# Altium footprint library WE-RJ45 LAN.PcbLib: 103 footprints (part 4 of 7)
Each footprint in its own frame and in the unit in brackets; x right, y up, seen from the top. Pads: shape width x height; smd on the part's side, far side on the other; paste and mask are expansions set on the pad; w line width, h text height; cw(c..) or ccw(c..) is an arc to the next point about the centre after c.
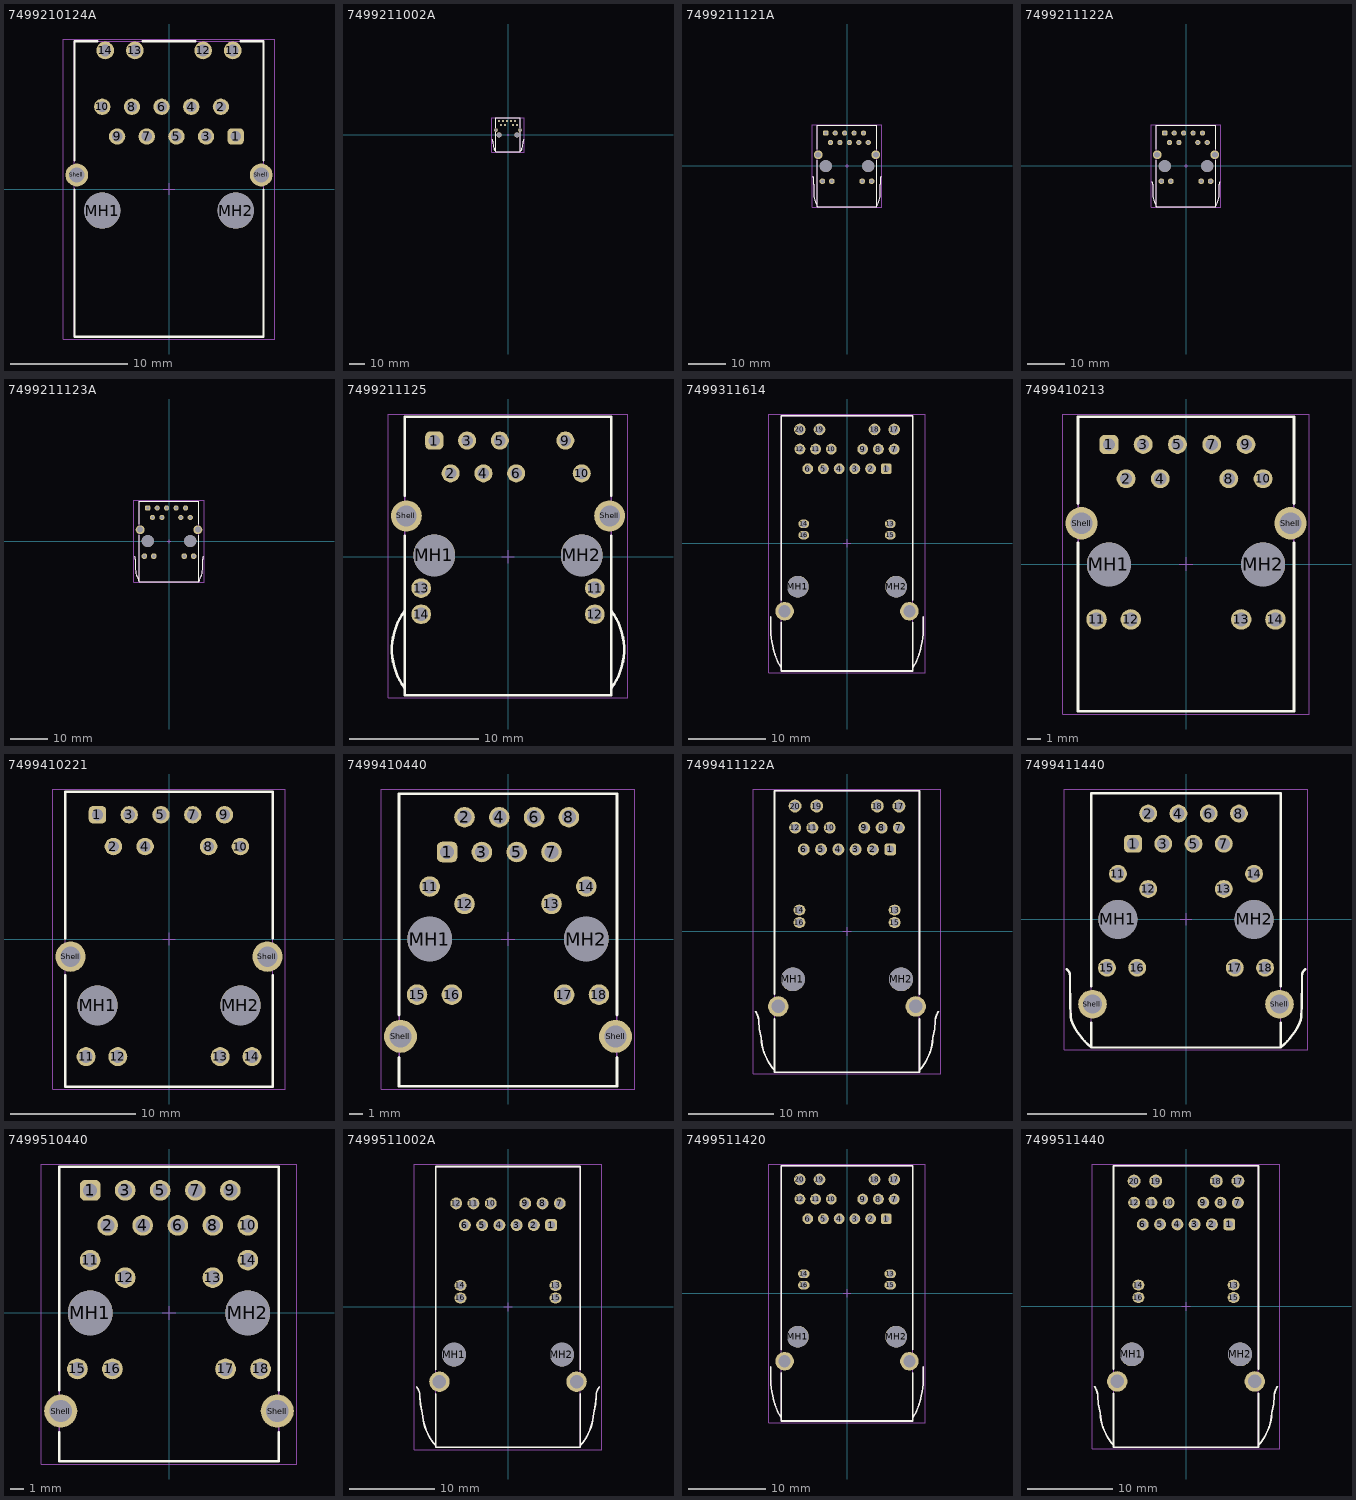
[diagram p3: the footprints below, top view; thin cyan lines are the x and y axes]

## 7499210124A [mm] "LAN Transformer, body 25.3x16.2mm"
height 13.5
pads (18):
  rrect50% 1.4x1.4 hole 0.9: 1(5.715,4.5)
  round 1.4 hole 0.9: 2(4.445,7.04) 3(3.175,4.5) 4(1.905,7.04) 5(0.635,4.5) 6(-0.635,7.04) 7(-1.905,4.5) 8(-3.175,7.04) 9(-4.445,4.5) 10(-5.715,7.04)
  round 1.52 hole 1.02: 11(5.465,11.87) 12(2.925,11.87) 13(-2.925,11.87) 14(-5.465,11.87)
  round 3.1 hole 3.1 unplated: MH1(-5.715,-1.85) MH2(5.715,-1.85)
  round 1.95 hole 1.3: Shell(-7.9,1.2) Shell(7.9,1.2)
Top Overlay:
  lines w0.2: -8.1,-0.05 -8.1,-12.65 8.1,-12.65 8.1,-0.05 ; -8.1,2.45 -8.1,12.65 -6.15,12.65 ; -2.24,12.65 2.24,12.65 ; 6.15,12.65 8.1,12.65 8.1,2.45
M11 Assembly Top:
  lines w0.1: -8.1,-12.65 -8.1,12.65 8.1,12.65 8.1,-12.65 -8.1,-12.65
  text ".Designator" at -1.75,-0.75 h1.5
M13 3D Top:
  lines w0.1: -8.1,-12.65 8.1,-12.65 8.1,12.65 -8.1,12.65 -8.1,-12.65
M15 Courtyard Top:
  lines w0.05: -0.5,0 0.5,0 ; 0,-0.5 0,0.5 ; -9.075,-12.85 9.075,-12.85 9.075,12.85 -9.075,12.85 -9.075,-12.85
3D body "7499210124A.stp": height 13.65, standoff -3.34, extent -8.1,-12.65 8.1,12.65

## 7499211002A [mm] "LAN Transformer, body 21.84x15.88mm"
height 13.74
pads (13):
  rrect50% 1.4x1.4 hole 0.9: 1(-5.715,8.86)
  round 1.4 hole 0.9: 2(-4.445,6.32) 3(-3.175,8.86) 4(-1.905,6.32) 5(-0.635,8.86) 7(1.905,8.86) 8(3.175,6.32) 9(4.445,8.86) 10(5.715,6.32)
  round 3.25 hole 3.25 unplated: MH1(-5.715,-0.03) MH2(5.715,-0.03)
  round 2.4 hole 1.6: Shell(-7.74,3.02) Shell(7.74,3.02)
Top Overlay:
  lines w0.2: -10.007,-3.268 cw(c-10.365,-3.895) -9.651,-3.996 ccw(c3.06,-5.02) -9.609,-6.473 ccw(c4.624,-3.611) -8.749,-9.262 cw(c-48.755,-34.72) -8.151,-10.228 cw(c-9.338,-11.119) -7.94,-10.62 ; -7.94,1.53 -7.94,-10.92 7.94,-10.92 7.94,1.53 ; -7.94,4.48 -7.94,10.92 7.94,10.92 7.94,4.48 ; 7.94,-10.62 cw(c9.338,-11.119) 8.151,-10.228 cw(c48.755,-34.72) 8.749,-9.262 ccw(c-4.624,-3.611) 9.609,-6.473 ccw(c-3.06,-5.02) 9.651,-3.996 cw(c10.365,-3.895) 10.007,-3.268
M11 Assembly Top:
  lines w0.1: -10.007,-3.268 cw(c-10.365,-3.895) -9.651,-3.996 ccw(c3.06,-5.02) -9.609,-6.473 ccw(c4.624,-3.611) -8.749,-9.262 cw(c-48.755,-34.72) -8.151,-10.228 cw(c-9.338,-11.119) -7.94,-10.62 ; 7.94,-10.62 cw(c9.338,-11.119) 8.151,-10.228 cw(c48.755,-34.72) 8.749,-9.262 ccw(c-4.624,-3.611) 9.609,-6.473 ccw(c-3.06,-5.02) 9.651,-3.996 cw(c10.365,-3.895) 10.007,-3.268 ; -7.94,-10.92 7.94,-10.92 7.94,10.92 -7.94,10.92 -7.94,-10.92
  text ".Designator" at -1.75,-0.75 h1.5
M13 3D Top:
  lines w0.1: -10.007,-3.268 cw(c-10.365,-3.895) -9.651,-3.996 ccw(c3.06,-5.02) -9.609,-6.473 ccw(c4.624,-3.611) -8.749,-9.262 cw(c-48.755,-34.72) -8.151,-10.228 cw(c-9.338,-11.119) -7.94,-10.62 ; 7.94,-10.62 cw(c9.338,-11.119) 8.151,-10.228 cw(c48.755,-34.72) 8.749,-9.262 ccw(c-4.624,-3.611) 9.609,-6.473 ccw(c-3.06,-5.02) 9.651,-3.996 cw(c10.365,-3.895) 10.007,-3.268 ; -7.94,-10.92 -7.94,10.92 7.94,10.92 7.94,-10.92 -7.94,-10.92
M15 Courtyard Top:
  lines w0.05: -0.5,0 0.5,0 ; 0,-0.5 0,0.5 ; -10.34,-11.12 10.46,-11.12 10.46,11.12 -10.34,11.12 -10.34,-11.12
3D body "7499211002A.stp": height 16.02, standoff -3.35, extent -10.14,-10.92 10.14,10.92

## 7499211121A [mm] "LAN Transformer, body 21.84x15.88mm"
height 13.95
pads (18):
  rrect50% 1.4x1.4 hole 0.9: 1(-5.715,8.86)
  round 1.4 hole 0.9: 2(-4.445,6.32) 3(-3.175,8.86) 4(-1.905,6.32) 5(-0.635,8.86) 6(0.635,6.32) 7(1.905,8.86) 8(3.175,6.32) 9(4.445,8.86) 10(5.715,6.32)
  round 1.52 hole 1.02: 11(-6.63,-4.11) 12(-4.09,-4.11) 13(4.09,-4.11) 14(6.63,-4.11)
  round 3.25 hole 3.25 unplated: MH1(-5.715,-0.03) MH2(5.715,-0.03)
  round 2.4 hole 1.6: Shell(-7.745,3.02) Shell(7.745,3.02)
Top Overlay:
  lines w0.2: -9.102,-2.811 cw(c-10.213,-3.423) -8.946,-3.48 -8.953,-4.892 ccw(c-5.338,-5.332) -8.98,-5.362 ccw(c15.684,-6.19) -8.909,-8.234 ccw(c-0.49,-6.715) -7.94,-10.92 ; -7.94,1.53 -7.94,-10.92 ; -7.94,4.53 -7.94,10.92 7.94,10.92 7.94,4.53 ; 7.94,1.53 7.94,-10.92 ; 9.102,-2.811 ccw(c10.213,-3.423) 8.946,-3.48 8.953,-4.892 cw(c5.338,-5.332) 8.98,-5.362 cw(c-15.684,-6.19) 8.909,-8.234 cw(c0.49,-6.715) 7.94,-10.92 ; -7.94,-10.92 7.94,-10.92
M11 Assembly Top:
  lines w0.1: -9.102,-2.811 cw(c-10.213,-3.423) -8.946,-3.48 -8.953,-4.892 ccw(c-5.338,-5.332) -8.98,-5.362 ccw(c15.684,-6.19) -8.909,-8.234 ccw(c-0.49,-6.715) -7.94,-10.92 ; 9.102,-2.811 ccw(c10.213,-3.423) 8.946,-3.48 8.953,-4.892 cw(c5.338,-5.332) 8.98,-5.362 cw(c-15.684,-6.19) 8.909,-8.234 cw(c0.49,-6.715) 7.94,-10.92 ; -7.94,-10.92 -7.94,10.92 7.94,10.92 7.94,-10.92 ; -7.94,-10.92 7.94,-10.92
  text ".Designator" at -1.75,-0.75 h1.5
M13 3D Top:
  lines w0.1: -9.102,-2.811 cw(c-10.213,-3.423) -8.946,-3.48 -8.953,-4.892 ccw(c-5.338,-5.332) -8.98,-5.362 ccw(c15.684,-6.19) -8.909,-8.234 ccw(c-0.49,-6.715) -7.94,-10.92 ; 9.102,-2.811 ccw(c10.213,-3.423) 8.946,-3.48 8.953,-4.892 cw(c5.338,-5.332) 8.98,-5.362 cw(c-15.684,-6.19) 8.909,-8.234 cw(c0.49,-6.715) 7.94,-10.92 ; -7.94,-10.92 7.94,-10.92 ; -7.94,-10.92 -7.94,10.92 7.94,10.92 7.94,-10.92
M15 Courtyard Top:
  lines w0.05: -0.5,0 0.5,0 ; 0,-0.5 0,0.5 ; -9.402,-11.12 -9.402,11.12 9.402,11.12 9.402,-11.12 -9.402,-11.12
3D body "7499211121A.stp": height 15.79, standoff -3.37, extent -9.111,-10.92 9.111,10.92

## 7499211122A [mm] "LAN Transformer, body 21.84x15.88mm"
height 13.74
pads (17):
  rrect50% 1.4x1.4 hole 0.9: 1(-5.715,8.86)
  round 1.4 hole 0.9: 2(-4.445,6.32) 3(-3.175,8.86) 4(-1.905,6.32) 5(-0.635,8.86) 7(1.905,8.86) 8(3.175,6.32) 9(4.445,8.86) 10(5.715,6.32)
  round 1.52 hole 1.02: 11(-6.63,-4.11) 12(-4.09,-4.11) 13(4.09,-4.11) 14(6.63,-4.11)
  round 3.25 hole 3.25 unplated: MH1(-5.715,-0.03) MH2(5.715,-0.03)
  round 2.4 hole 1.6: Shell(-7.745,3.02) Shell(7.745,3.02)
Top Overlay:
  lines w0.2: -9.109,-4.223 cw(c-10.22,-4.835) -8.953,-4.892 ccw(c-5.338,-5.332) -8.98,-5.362 ccw(c15.684,-6.19) -8.909,-8.234 ccw(c-0.49,-6.715) -7.94,-10.92 ; -7.94,1.53 -7.94,-10.92 ; -7.94,4.48 -7.94,10.92 7.94,10.92 7.94,4.48 ; 7.94,1.53 7.94,-10.92 ; 9.109,-4.223 ccw(c10.22,-4.835) 8.953,-4.892 cw(c5.338,-5.332) 8.98,-5.362 cw(c-15.684,-6.19) 8.909,-8.234 cw(c0.49,-6.715) 7.94,-10.92 ; -7.94,-10.92 7.94,-10.92
M11 Assembly Top:
  lines w0.1: -9.109,-4.223 cw(c-10.22,-4.835) -8.953,-4.892 ccw(c-5.338,-5.332) -8.98,-5.362 ccw(c15.684,-6.19) -8.909,-8.234 ccw(c-0.49,-6.715) -7.94,-10.92 ; 9.109,-4.223 ccw(c10.22,-4.835) 8.953,-4.892 cw(c5.338,-5.332) 8.98,-5.362 cw(c-15.684,-6.19) 8.909,-8.234 cw(c0.49,-6.715) 7.94,-10.92 ; -7.94,-10.92 7.94,-10.92 ; -7.94,-10.92 -7.94,10.92 7.94,10.92 7.94,-10.92
  text ".Designator" at -1.75,-0.75 h1.5
M13 3D Top:
  lines w0.1: -9.109,-4.223 cw(c-10.22,-4.835) -8.953,-4.892 ccw(c-5.338,-5.332) -8.98,-5.362 ccw(c15.684,-6.19) -8.909,-8.234 ccw(c-0.49,-6.715) -7.94,-10.92 ; 9.109,-4.223 ccw(c10.22,-4.835) 8.953,-4.892 cw(c5.338,-5.332) 8.98,-5.362 cw(c-15.684,-6.19) 8.909,-8.234 cw(c0.49,-6.715) 7.94,-10.92 ; -7.94,-10.92 -7.94,10.92 7.94,10.92 7.94,-10.92 ; -7.94,-10.92 7.94,-10.92
M15 Courtyard Top:
  lines w0.05: -0.5,0 0.5,0 ; 0,-0.5 0,0.5 ; -9.41,-11.12 9.41,-11.12 9.41,11.12 -9.41,11.12 -9.41,-11.12
3D body "7499211122A.stp": height 15.24, standoff -3.32, extent -9.163,-10.92 9.163,10.92

## 7499211123A [mm] "LAN Transformer, body 21.6x16mm"
height 13.95
pads (17):
  rrect50% 1.4x1.4 hole 0.9: 1(-5.715,8.98)
  round 1.4 hole 0.9: 2(-4.445,6.44) 3(-3.175,8.98) 4(-1.905,6.44) 5(-0.635,8.98) 7(1.905,8.98) 8(3.175,6.44) 9(4.445,8.98) 10(5.715,6.44)
  round 1.52 hole 1.02: 11(-6.63,-3.97) 12(-4.09,-3.97) 13(4.09,-3.97) 14(6.63,-3.97)
  round 3.25 hole 3.25 unplated: MH1(-5.715,0.09) MH2(5.715,0.09)
  round 2.4 hole 1.6: Shell(-7.745,3.14) Shell(7.745,3.14)
Top Overlay:
  lines w0.2: -9.169,-4.103 cw(c-10.28,-4.715) -9.013,-4.772 ccw(c-5.398,-5.212) -9.04,-5.242 ccw(c15.624,-6.07) -8.969,-8.114 ccw(c-0.55,-6.595) -8,-10.8 ; -8,1.65 -8,-10.8 ; -8,4.6 -8,10.8 8,10.8 8,4.6 ; 8,1.65 8,-10.8 ; 9.169,-4.103 ccw(c10.28,-4.715) 9.013,-4.772 cw(c5.398,-5.212) 9.04,-5.242 cw(c-15.624,-6.07) 8.969,-8.114 cw(c0.55,-6.595) 8,-10.8 ; -8,-10.8 8,-10.8
M11 Assembly Top:
  lines w0.1: -9.169,-4.103 cw(c-10.28,-4.715) -9.013,-4.772 ccw(c-5.398,-5.212) -9.04,-5.242 ccw(c15.624,-6.07) -8.969,-8.114 ccw(c-0.55,-6.595) -8,-10.8 ; 9.169,-4.103 ccw(c10.28,-4.715) 9.013,-4.772 cw(c5.398,-5.212) 9.04,-5.242 cw(c-15.624,-6.07) 8.969,-8.114 cw(c0.55,-6.595) 8,-10.8 ; -8,-10.8 8,-10.8 ; -8,-10.8 -8,10.8 8,10.8 8,-10.8
  text ".Designator" at -1.75,-0.75 h1.5
M13 3D Top:
  lines w0.1: -9.169,-4.103 cw(c-10.28,-4.715) -9.013,-4.772 ccw(c-5.398,-5.212) -9.04,-5.242 ccw(c15.624,-6.07) -8.969,-8.114 ccw(c-0.55,-6.595) -8,-10.8 ; 9.169,-4.103 ccw(c10.28,-4.715) 9.013,-4.772 cw(c5.398,-5.212) 9.04,-5.242 cw(c-15.624,-6.07) 8.969,-8.114 cw(c0.55,-6.595) 8,-10.8 ; -8,-10.8 -8,10.8 8,10.8 8,-10.8 ; -8,-10.8 8,-10.8
M15 Courtyard Top:
  lines w0.05: -0.5,0 0.5,0 ; 0,-0.5 0,0.5 ; -9.47,-11 -9.47,11 9.47,11 9.47,-11 -9.47,-11
3D body "7499211123A.stp": height 15.27, standoff -3.6, extent -9.223,-10.8 9.223,10.8

## 7499211125 [mm] "LAN Transformer, body 21.3x16mm"
height 13.55
pads (16):
  rrect50% 1.4x1.4 hole 0.89: 1(-5.715,8.99)
  round 1.4 hole 0.89: 2(-4.445,6.45) 3(-3.175,8.99) 4(-1.905,6.45) 5(-0.635,8.99) 6(0.635,6.45) 9(4.445,8.99) 10(5.715,6.45)
  round 1.52 hole 1.02: 11(6.725,-2.44) 12(6.725,-4.47) 13(-6.725,-2.44) 14(-6.725,-4.47)
  round 3.25 hole 3.25 unplated: MH1(-5.715,0.1) MH2(5.715,0.1)
  round 2.4 hole 1.6: Shell(-7.875,3.15) Shell(7.875,3.15)
Top Overlay:
  lines w0.2: -8,-10.2 cw(c-4,-7.2) -8,-4.2 ; -8,1.6 -8,-10.75 8,-10.75 8,1.6 ; -8,4.7 -8,10.85 8,10.85 8,4.7 ; 8,-10.2 ccw(c4,-7.2) 8,-4.2
M11 Assembly Top:
  lines w0.1: -8,-10.2 cw(c-4,-7.2) -8,-4.2 ; 8,-10.2 ccw(c4,-7.2) 8,-4.2 ; -8,-10.75 -8,10.85 8,10.85 8,-10.75 ; -8,-10.75 8,-10.75 ; -8,-10.75 8,-10.75
  text ".Designator" at -1.75,-0.75 h1.5
M13 3D Top:
  lines w0.1: -8,-10.2 cw(c-4,-7.2) -8,-4.2 ; 8,-10.2 ccw(c4,-7.2) 8,-4.2 ; -8,-10.75 8,-10.75 8,10.85 -8,10.85 -8,-10.75
M15 Courtyard Top:
  lines w0.05: -0.5,0 0.5,0 ; 0,-0.5 0,0.5 ; -9.275,-10.95 9.275,-10.95 9.275,11.05 -9.275,11.05 -9.275,-10.95
3D body "7499211125.stp": height 14.65, standoff -2.98, extent -8.956,-10.75 8.956,10.85

## 7499311614 [mm] "10/100/1000 Base-T, PoE, THT, 1x1, Tab up, with shield tabs, with LED L-R green/orange-yellow, ETR"
height 13.87
pads (24):
  rrect50% 1.4x1.4 hole 0.89: 1(5.075,9.63)
  round 1.4 hole 0.89: 2(3.045,9.63) 3(1.015,9.63) 4(-1.015,9.63) 5(-3.045,9.63) 6(-5.075,9.63) 7(6.09,12.17) 8(4.06,12.17) 9(2.03,12.17) 10(-2.03,12.17) 11(-4.06,12.17) 12(-6.09,12.17)
  oval 1.4x1.1 hole 0.89: 13(5.59,2.51) 14(-5.59,2.51) 15(5.59,1.05) 16(-5.59,1.05)
  round 1.5 hole 1.02: 17(6.095,14.71) 18(3.555,14.71) 19(-3.555,14.71) 20(-6.095,14.71)
  round 2.8 hole 2.8 unplated: MH1(-6.35,-5.61) MH2(6.35,-5.61)
  round 2.4 hole 1.57: Shell(-8.065,-8.79) Shell(8.065,-8.79)
Top Overlay:
  lines w0.2: -9.857,-9.51 -9.857,-11.238 ccw(c1.3,-10.91) -9.621,-13.217 ccw(c-1.503,-11.736) -8.5,-16.11 ; -8.5,-10.21 -8.5,-16.51 8.5,-16.51 8.5,-10.21 ; -8.5,-7.37 -8.5,16.51 8.5,16.51 8.5,-7.37 ; 8.5,-16.11 ccw(c1.503,-11.736) 9.621,-13.217 ccw(c-1.3,-10.91) 9.857,-11.238 9.857,-9.51
M11 Assembly Top:
  lines w0.1: -9.857,-9.51 -9.857,-11.238 ccw(c1.3,-10.91) -9.621,-13.217 ccw(c-1.503,-11.736) -8.5,-16.11 ; 8.5,-16.11 ccw(c1.503,-11.736) 9.621,-13.217 ccw(c-1.3,-10.91) 9.857,-11.238 9.857,-9.51 ; -8.5,-16.51 -8.5,16.51 8.5,16.51 8.5,-16.51 -8.5,-16.51
  text ".Designator" at -1.75,-0.75 h1.5
M13 3D Top:
  lines w0.1: -9.857,-9.51 -9.857,-11.238 ccw(c1.3,-10.91) -9.621,-13.217 ccw(c-1.503,-11.736) -8.5,-16.11 ; 8.5,-16.11 ccw(c1.503,-11.736) 9.621,-13.217 ccw(c-1.3,-10.91) 9.857,-11.238 9.857,-9.51 ; -8.5,-16.51 8.5,-16.51 8.5,16.51 -8.5,16.51 -8.5,-16.51
M15 Courtyard Top:
  lines w0.05: -0.5,0 0.5,0 ; 0,-0.5 0,0.5 ; -10.09,-16.71 -10.09,16.71 10.09,16.71 10.09,-16.71 -10.09,-16.71
3D body "7499311614.stp": height 15.53, standoff -3.32, extent -9.89,-16.51 9.89,16.51

## 7499410213 [mm] "LAN Transformer, body 21.84x16mm"
height 13.74
pads (17):
  rrect50% 1.4x1.4 hole 0.9: 1(-5.715,8.86)
  round 1.4 hole 0.9: 2(-4.445,6.32) 3(-3.175,8.86) 4(-1.905,6.32) 5(-0.635,8.86) 7(1.905,8.86) 8(3.175,6.32) 9(4.445,8.86) 10(5.715,6.32)
  round 1.52 hole 1.02: 11(-6.63,-4.11) 12(-4.09,-4.11) 13(4.09,-4.11) 14(6.63,-4.11)
  round 3.25 hole 3.25 unplated: MH1(-5.715,-0.03) MH2(5.715,-0.03)
  round 2.4 hole 1.6: Shell(-7.745,3.02) Shell(7.745,3.02)
Top Overlay:
  lines w0.2: -8,1.58 -8,-10.92 8,-10.92 8,1.58 ; -8,4.48 -8,10.92 8,10.92 8,4.48
M11 Assembly Top:
  lines w0.1: -8,-10.92 -8,10.92 8,10.92 8,-10.92 -8,-10.92
  text ".Designator" at -1.75,-0.75 h1.5
M13 3D Top:
  lines w0.1: -8,-10.92 8,-10.92 8,10.92 -8,10.92 -8,-10.92
M15 Courtyard Top:
  lines w0.05: -0.5,0 0.5,0 ; 0,-0.5 0,0.5 ; -9.145,-11.12 9.145,-11.12 9.145,11.12 -9.145,11.12 -9.145,-11.12
3D body "7499410213.stp": height 13.92, standoff -3.25, extent -8,-10.92 8,10.92

## 7499410221 [mm] "LAN Transformer, body 23.6x16.6mm"
height 17.1
pads (17):
  rrect50% 1.4x1.4 hole 0.89: 1(-5.72,9.94)
  round 1.4 hole 0.89: 2(-4.45,7.4) 3(-3.18,9.94) 4(-1.91,7.4) 5(-0.64,9.94) 7(1.9,9.94) 8(3.17,7.4) 9(4.44,9.94) 10(5.71,7.4)
  round 1.52 hole 1.02: 11(-6.635,-9.41) 12(-4.095,-9.41) 13(4.095,-9.41) 14(6.635,-9.41)
  round 3.2 hole 3.2 unplated: MH1(-5.715,-5.3) MH2(5.715,-5.3)
  round 2.43 hole 1.63: Shell(-7.875,-1.41) Shell(7.875,-1.41)
Top Overlay:
  lines w0.2: -8.3,-2.9 -8.3,-11.8 8.3,-11.8 8.3,-2.9 ; -8.3,0.05 -8.3,11.8 8.3,11.8 8.3,0.05
M11 Assembly Top:
  lines w0.1: -8.3,-11.8 -8.3,11.8 8.3,11.8 8.3,-11.8 -8.3,-11.8
  text ".Designator" at -1.75,-0.75 h1.5
M13 3D Top:
  lines w0.1: -8.3,-11.8 8.3,-11.8 8.3,11.8 -8.3,11.8 -8.3,-11.8
M15 Courtyard Top:
  lines w0.05: -0.5,0 0.5,0 ; 0,-0.5 0,0.5 ; -9.29,-12 9.29,-12 9.29,12 -9.29,12 -9.29,-12
3D body "7499410221.stp": height 17.65, standoff -2.25, extent -8.3,-11.8 8.3,11.8

## 7499410440 [mm] "10/100Base-T, PoE+, THT, 1x1, Tab down, w/o shield tabs, with LED L: green/yellow,   R: green/yellow, ETR"
height 13.65
pads (20):
  rrect50% 1.5x1.5 hole 1.02: 1(-4.445,6.35)
  round 1.5 hole 1.02: 2(-3.175,8.89) 3(-1.905,6.35) 4(-0.635,8.89) 5(0.635,6.35) 6(1.905,8.89) 7(3.175,6.35) 8(4.445,8.89) 11(-5.715,3.83) 12(-3.175,2.56) 13(3.175,2.56) 14(5.715,3.83) 15(-6.64,-4.06) 16(-4.1,-4.06) 17(4.1,-4.06) 18(6.64,-4.06)
  round 3.25 hole 3.25 unplated: MH1(-5.715,0) MH2(5.715,0)
  round 2.4 hole 1.6: Shell(-7.85,-7.11) Shell(7.85,-7.11)
Top Overlay:
  lines w0.2: -7.95,-8.65 -7.95,-10.75 7.95,-10.75 7.95,-8.65 ; -7.95,-5.55 -7.95,10.6 7.95,10.6 7.95,-5.55
M11 Assembly Top:
  lines w0.1: -7.95,-10.75 -7.95,10.6 7.95,10.6 7.95,-10.75 -7.95,-10.75
  text ".Designator" at -1.75,-0.75 h1.5
M13 3D Top:
  lines w0.1: -7.95,-10.75 7.95,-10.75 7.95,10.6 -7.95,10.6 -7.95,-10.75
M15 Courtyard Top:
  lines w0.05: -0.5,0 0.5,0 ; 0,-0.5 0,0.5 ; -9.25,-10.95 -9.25,10.95 9.25,10.95 9.25,-10.95 -9.25,-10.95
3D body "7499410440.stp": height 13.65, standoff -3.55, extent -8.1,-11 8.1,10.5

## 7499411122A [mm] "LAN Transformer, body 33.02x17mm"
height 13.87
pads (24):
  rrect50% 1.4x1.4 hole 0.9: 1(5.075,9.63)
  round 1.4 hole 0.9: 2(3.045,9.63) 3(1.015,9.63) 4(-1.015,9.63) 5(-3.045,9.63) 6(-5.075,9.63) 7(6.09,12.17) 8(4.06,12.17) 9(2.03,12.17) 10(-2.03,12.17) 11(-4.06,12.17) 12(-6.09,12.17)
  oval 1.4x1.25 hole 0.9: 13(5.59,2.51) 14(-5.59,2.51) 15(5.59,1.05) 16(-5.59,1.05)
  round 1.52 hole 1.02: 17(6.095,14.71) 18(3.555,14.71) 19(-3.555,14.71) 20(-6.095,14.71)
  round 2.8 hole 2.8 unplated: MH1(-6.35,-5.61) MH2(6.35,-5.61)
  round 2.4 hole 1.6: Shell(-8.065,-8.79) Shell(8.065,-8.79)
Top Overlay:
  lines w0.2: -10.72,-9.424 cw(c-12.105,-10.49) -10.36,-10.589 ; -10.357,-10.486 -10.281,-11.433 -10.067,-12.498 ccw(c-3.705,-12.1) -8.5,-16.3 ; -8.5,-10.25 -8.5,-16.51 8.5,-16.51 8.5,-10.25 ; -8.5,-7.35 -8.5,16.51 8.5,16.51 8.5,-7.35 ; 8.5,-16.3 ccw(c3.705,-12.1) 10.067,-12.498 10.281,-11.433 10.357,-10.486 ; 10.36,-10.589 cw(c12.105,-10.49) 10.72,-9.424
M11 Assembly Top:
  lines w0.1: -10.72,-9.424 cw(c-12.105,-10.49) -10.36,-10.589 ; -10.357,-10.486 -10.281,-11.433 -10.067,-12.498 ccw(c-3.705,-12.1) -8.5,-16.3 ; 8.5,-16.3 ccw(c3.705,-12.1) 10.067,-12.498 10.281,-11.433 10.357,-10.486 ; 10.36,-10.589 cw(c12.105,-10.49) 10.72,-9.424 ; -8.5,-16.51 8.5,-16.51 8.5,16.51 -8.5,16.51 -8.5,-16.51
  text ".Designator" at -1.75,-0.75 h1.5
M13 3D Top:
  lines w0.1: -10.72,-9.424 cw(c-12.105,-10.49) -10.36,-10.589 ; -10.357,-10.486 -10.281,-11.433 -10.067,-12.498 ccw(c-3.705,-12.1) -8.5,-16.3 ; 8.5,-16.3 ccw(c3.705,-12.1) 10.067,-12.498 10.281,-11.433 10.357,-10.486 ; 10.36,-10.589 cw(c12.105,-10.49) 10.72,-9.424 ; -8.5,-16.51 -8.5,16.51 8.5,16.51 8.5,-16.51 -8.5,-16.51
M15 Courtyard Top:
  lines w0.05: -0.5,0 0.5,0 ; 0,-0.5 0,0.5 ; -11.02,-16.71 -11.02,16.71 11.02,16.71 11.02,-16.71 -11.02,-16.71
3D body "7499411122A.stp": height 16.21, standoff -3.14, extent -10.8,-16.51 10.8,16.51

## 7499411440 [mm] "10/100Base-T, PoE+, THT, 1x1, Tab down, with shield tabs, with LED L: green/yellow,   R: green/yellow, ETR"
height 13.65
pads (20):
  rrect50% 1.5x1.5 hole 1.02: 1(-4.445,6.35)
  round 1.5 hole 1.02: 2(-3.175,8.89) 3(-1.905,6.35) 4(-0.635,8.89) 5(0.635,6.35) 6(1.905,8.89) 7(3.175,6.35) 8(4.445,8.89) 11(-5.715,3.83) 12(-3.175,2.56) 13(3.175,2.56) 14(5.715,3.83) 15(-6.64,-4.06) 16(-4.1,-4.06) 17(4.1,-4.06) 18(6.64,-4.06)
  round 3.25 hole 3.25 unplated: MH1(-5.715,0) MH2(5.715,0)
  round 2.4 hole 1.6: Shell(-7.85,-7.11) Shell(7.85,-7.11)
Top Overlay:
  lines w0.2: -10.035,-4.163 cw(c-10.456,-4.749) -9.742,-4.85 -9.704,-7.455 ccw(c-2.825,-7.355) -9.678,-7.955 ccw(c-7.625,-7.955) -9.553,-8.66 ccw(c-4.125,-6.155) -7.95,-10.75 ; -7.95,-8.65 -7.95,-10.75 ; -7.95,-5.6 -7.95,10.6 7.95,10.6 7.95,-5.6 ; 7.95,-8.65 7.95,-10.75 ; 10.035,-4.163 ccw(c10.456,-4.749) 9.742,-4.85 9.704,-7.455 cw(c2.825,-7.355) 9.678,-7.955 cw(c7.625,-7.955) 9.553,-8.66 cw(c4.125,-6.155) 7.95,-10.75 ; -7.95,-10.75 7.95,-10.75
M11 Assembly Top:
  lines w0.1: -10.035,-4.163 cw(c-10.456,-4.749) -9.742,-4.85 -9.704,-7.455 ccw(c-2.825,-7.355) -9.678,-7.955 ccw(c-7.625,-7.955) -9.553,-8.66 ccw(c-4.125,-6.155) -7.95,-10.75 ; 10.035,-4.163 ccw(c10.456,-4.749) 9.742,-4.85 9.704,-7.455 cw(c2.825,-7.355) 9.678,-7.955 cw(c7.625,-7.955) 9.553,-8.66 cw(c4.125,-6.155) 7.95,-10.75 ; -7.95,-10.75 -7.95,10.6 7.95,10.6 7.95,-10.75 ; -7.95,-10.75 7.95,-10.75
  text ".Designator" at -1.75,-0.75 h1.5
M13 3D Top:
  lines w0.1: -10.035,-4.163 cw(c-10.456,-4.749) -9.742,-4.85 -9.704,-7.455 ccw(c-2.825,-7.355) -9.678,-7.955 ccw(c-7.625,-7.955) -9.553,-8.66 ccw(c-4.125,-6.155) -7.95,-10.75 ; 10.035,-4.163 ccw(c10.456,-4.749) 9.742,-4.85 9.704,-7.455 cw(c2.825,-7.355) 9.678,-7.955 cw(c7.625,-7.955) 9.553,-8.66 cw(c4.125,-6.155) 7.95,-10.75 ; -7.95,-10.75 7.95,-10.75 ; -7.95,-10.75 -7.95,10.6 7.95,10.6 7.95,-10.75
M15 Courtyard Top:
  lines w0.05: -0.5,0 0.5,0 ; 0,-0.5 0,0.5 ; -10.2,-10.95 10.2,-10.95 10.2,10.95 -10.2,10.95 -10.2,-10.95
3D body "7499411440.stp": height 15.55, standoff -3.55, extent -9.866,-11 9.866,10.5

## 7499510440 [mm] "10/100/1000Base-T, PoE+, THT, 1x1, Tab down, w/o shield tabs, with LED L: green/yellow,   R: green/yellow, ETR"
height 13.65
pads (22):
  rrect50% 1.5x1.5 hole 1.02: 1(-5.715,8.89)
  round 1.5 hole 1.02: 2(-4.445,6.35) 3(-3.175,8.89) 4(-1.905,6.35) 5(-0.635,8.89) 6(0.635,6.35) 7(1.905,8.89) 8(3.175,6.35) 9(4.445,8.89) 10(5.715,6.35) 11(-5.715,3.83) 12(-3.175,2.56) 13(3.175,2.56) 14(5.715,3.83) 15(-6.64,-4.06) 16(-4.1,-4.06) 17(4.1,-4.06) 18(6.64,-4.06)
  round 3.25 hole 3.25 unplated: MH1(-5.715,0) MH2(5.715,0)
  round 2.4 hole 1.6: Shell(-7.85,-7.11) Shell(7.85,-7.11)
Top Overlay:
  lines w0.2: -7.95,-8.65 -7.95,-10.75 7.95,-10.75 7.95,-8.65 ; -7.95,-5.6 -7.95,10.6 7.95,10.6 7.95,-5.6
M11 Assembly Top:
  lines w0.1: -7.95,-10.75 7.95,-10.75 7.95,10.6 -7.95,10.6 -7.95,-10.75
  text ".Designator" at -1.75,-0.75 h1.5
M13 3D Top:
  lines w0.1: -7.95,-10.75 -7.95,10.6 7.95,10.6 7.95,-10.75 -7.95,-10.75
M15 Courtyard Top:
  lines w0.05: -0.5,0 0.5,0 ; 0,-0.5 0,0.5 ; -9.25,-10.95 -9.25,10.8 9.25,10.8 9.25,-10.95 -9.25,-10.95
3D body "7499510440.stp": height 13.65, standoff -3.55, extent -8.1,-11 8.1,10.5

## 7499511002A [mm] "LAN Transformer, body 33.02x17.02mm"
height 13.87
pads (20):
  rrect50% 1.4x1.4 hole 0.9: 1(5.075,9.63)
  round 1.4 hole 0.9: 2(3.045,9.63) 3(1.015,9.63) 4(-1.015,9.63) 5(-3.045,9.63) 6(-5.075,9.63) 7(6.09,12.17) 8(4.06,12.17) 9(2.03,12.17) 10(-2.03,12.17) 11(-4.06,12.17) 12(-6.09,12.17)
  oval 1.4x1.25 hole 0.9: 13(5.59,2.52) 14(-5.59,2.52) 15(5.59,1.05) 16(-5.59,1.05)
  round 2.8 hole 2.8 unplated: MH1(-6.35,-5.61) MH2(6.35,-5.61)
  round 2.4 hole 1.6: Shell(-8.065,-8.79) Shell(8.065,-8.79)
Top Overlay:
  lines w0.2: -10.73,-9.424 cw(c-12.115,-10.49) -10.37,-10.589 ; -10.367,-10.486 -10.291,-11.433 -10.077,-12.498 ccw(c-3.715,-12.1) -8.51,-16.3 ; -8.51,-10.21 -8.51,-16.51 8.51,-16.51 8.51,-10.21 ; -8.51,-7.36 -8.51,16.51 8.51,16.51 8.51,-7.36 ; 8.51,-16.3 ccw(c3.715,-12.1) 10.077,-12.498 10.291,-11.433 10.367,-10.486 ; 10.37,-10.589 cw(c12.115,-10.49) 10.73,-9.424
M11 Assembly Top:
  lines w0.1: -10.73,-9.424 cw(c-12.115,-10.49) -10.37,-10.589 ; -10.367,-10.486 -10.291,-11.433 -10.077,-12.498 ccw(c-3.715,-12.1) -8.51,-16.3 ; 8.51,-16.3 ccw(c3.715,-12.1) 10.077,-12.498 10.291,-11.433 10.367,-10.486 ; 10.37,-10.589 cw(c12.115,-10.49) 10.73,-9.424 ; -8.51,-16.51 -8.51,16.51 8.51,16.51 8.51,-16.51 -8.51,-16.51
  text ".Designator" at -1.75,-0.75 h1.5
M13 3D Top:
  lines w0.1: -10.73,-9.424 cw(c-12.115,-10.49) -10.37,-10.589 ; -10.367,-10.486 -10.291,-11.433 -10.077,-12.498 ccw(c-3.715,-12.1) -8.51,-16.3 ; 8.51,-16.3 ccw(c3.715,-12.1) 10.077,-12.498 10.291,-11.433 10.367,-10.486 ; 10.37,-10.589 cw(c12.115,-10.49) 10.73,-9.424 ; -8.51,-16.51 8.51,-16.51 8.51,16.51 -8.51,16.51 -8.51,-16.51
M15 Courtyard Top:
  lines w0.05: -0.5,0 0.5,0 ; 0,-0.5 0,0.5 ; -11.03,-16.81 -11.03,16.81 11.03,16.81 11.03,-16.81 -11.03,-16.81
3D body "7499511002A.stp": height 16.21, standoff -3.64, extent -10.81,-16.51 10.81,16.51

## 7499511420 [mm] "10/100/1000 Base-T, PoE+, THT, 1x1, Tab up, with shield tabs, with LED L-R green/yellow-green/yellow"
height 13.87
pads (24):
  rrect50% 1.4x1.4 hole 0.89: 1(5.075,9.63)
  round 1.4 hole 0.89: 2(3.045,9.63) 3(1.015,9.63) 4(-1.015,9.63) 5(-3.045,9.63) 6(-5.075,9.63) 7(6.09,12.17) 8(4.06,12.17) 9(2.03,12.17) 10(-2.03,12.17) 11(-4.06,12.17) 12(-6.09,12.17)
  oval 1.5x1.1 hole 0.89: 13(5.59,2.51) 14(-5.59,2.51) 15(5.59,1.05) 16(-5.59,1.05)
  round 1.5 hole 1.02: 17(6.095,14.71) 18(3.555,14.71) 19(-3.555,14.71) 20(-6.095,14.71)
  round 2.8 hole 2.8 unplated: MH1(-6.35,-5.61) MH2(6.35,-5.61)
  round 2.4 hole 1.57: Shell(-8.065,-8.79) Shell(8.065,-8.79)
Top Overlay:
  lines w0.2: -9.857,-9.51 -9.857,-11.238 ccw(c1.3,-10.91) -9.621,-13.217 ccw(c-1.503,-11.736) -8.5,-16.11 ; -8.5,-10.26 -8.5,-16.51 8.5,-16.51 8.5,-10.26 ; -8.5,-7.32 -8.5,16.51 8.5,16.51 8.5,-7.32 ; 8.5,-16.11 ccw(c1.503,-11.736) 9.621,-13.217 ccw(c-1.3,-10.91) 9.857,-11.238 9.857,-9.51
M11 Assembly Top:
  lines w0.1: -9.857,-9.51 -9.857,-11.238 ccw(c1.3,-10.91) -9.621,-13.217 ccw(c-1.503,-11.736) -8.5,-16.11 ; 8.5,-16.11 ccw(c1.503,-11.736) 9.621,-13.217 ccw(c-1.3,-10.91) 9.857,-11.238 9.857,-9.51 ; -8.5,-16.51 -8.5,16.51 8.5,16.51 8.5,-16.51 -8.5,-16.51
  text ".Designator" at -1.75,-0.75 h1.5
M13 3D Top:
  lines w0.1: -9.857,-9.51 -9.857,-11.238 ccw(c1.3,-10.91) -9.621,-13.217 ccw(c-1.503,-11.736) -8.5,-16.11 ; 8.5,-16.11 ccw(c1.503,-11.736) 9.621,-13.217 ccw(c-1.3,-10.91) 9.857,-11.238 9.857,-9.51 ; -8.5,-16.51 8.5,-16.51 8.5,16.51 -8.5,16.51 -8.5,-16.51
M15 Courtyard Top:
  lines w0.05: -0.5,0 0.5,0 ; 0,-0.5 0,0.5 ; -10.09,-16.71 -10.09,16.71 10.09,16.71 10.09,-16.71 -10.09,-16.71
3D body "7499511420.stp": height 15.53, standoff -3.32, extent -9.89,-16.51 9.89,16.51

## 7499511440 [mm] "LAN Transformer, body 33.02x17mm"
height 13.87
pads (24):
  rrect50% 1.4x1.4 hole 0.89: 1(5.075,9.63)
  round 1.4 hole 0.89: 2(3.045,9.63) 3(1.015,9.63) 4(-1.015,9.63) 5(-3.045,9.63) 6(-5.075,9.63) 7(6.09,12.17) 8(4.06,12.17) 9(2.03,12.17) 10(-2.03,12.17) 11(-4.06,12.17) 12(-6.09,12.17)
  oval 1.4x1.25 hole 0.89: 13(5.59,2.51) 14(-5.59,2.51) 15(5.59,1.05) 16(-5.59,1.05)
  round 1.52 hole 1.02: 17(6.095,14.71) 18(3.555,14.71) 19(-3.555,14.71) 20(-6.095,14.71)
  round 2.8 hole 2.8 unplated: MH1(-6.35,-5.61) MH2(6.35,-5.61)
  round 2.4 hole 1.57: Shell(-8.065,-8.79) Shell(8.065,-8.79)
Top Overlay:
  lines w0.2: -10.72,-9.424 cw(c-12.105,-10.49) -10.36,-10.589 ; -10.357,-10.486 -10.281,-11.433 -10.067,-12.498 ccw(c-3.705,-12.1) -8.5,-16.3 ; -8.5,-10.21 -8.5,-16.51 8.5,-16.51 8.5,-10.21 ; -8.5,-7.36 -8.5,16.51 8.5,16.51 8.5,-7.36 ; 8.5,-16.3 ccw(c3.705,-12.1) 10.067,-12.498 10.281,-11.433 10.357,-10.486 ; 10.36,-10.589 cw(c12.105,-10.49) 10.72,-9.424
M11 Assembly Top:
  lines w0.1: -10.72,-9.424 cw(c-12.105,-10.49) -10.36,-10.589 ; -10.357,-10.486 -10.281,-11.433 -10.067,-12.498 ccw(c-3.705,-12.1) -8.5,-16.3 ; 8.5,-16.3 ccw(c3.705,-12.1) 10.067,-12.498 10.281,-11.433 10.357,-10.486 ; 10.36,-10.589 cw(c12.105,-10.49) 10.72,-9.424 ; -8.5,-16.51 -8.5,16.51 8.5,16.51 8.5,-16.51 -8.5,-16.51
  text ".Designator" at -1.75,-0.75 h1.5
M13 3D Top:
  lines w0.1: -10.72,-9.424 cw(c-12.105,-10.49) -10.36,-10.589 ; -10.357,-10.486 -10.281,-11.433 -10.067,-12.498 ccw(c-3.705,-12.1) -8.5,-16.3 ; 8.5,-16.3 ccw(c3.705,-12.1) 10.067,-12.498 10.281,-11.433 10.357,-10.486 ; 10.36,-10.589 cw(c12.105,-10.49) 10.72,-9.424 ; -8.5,-16.51 8.5,-16.51 8.5,16.51 -8.5,16.51 -8.5,-16.51
M15 Courtyard Top:
  lines w0.05: -0.5,0 0.5,0 ; 0,-0.5 0,0.5 ; -11.02,-16.71 -11.02,16.71 11.02,16.71 11.02,-16.71 -11.02,-16.71
3D body "7499511440.stp": height 16.21, standoff -3.64, extent -10.8,-16.51 10.8,16.51